# Altium schematic symbol library BARKO_SCHLIB.SchLib: 1064 symbols (part 3 of 11) (continued)
## CON-HEADER-40POS-2.54-R/A
designator CON?, comment PRPC040SGAN-M71RC
CONN HEADER R/A 40POS 2.54MM; Manufacturer: Sullins; Number of Positions: 40; Connector Type: Male Pin; Pitch: 0.1inch; Washability: OK; .Creator: M.OZKAN; .PCBCHK: USED; Supplier 1: Digi-Key; Manufacturer Part Number: PRPC040SGAN-M71RC; Stock 1: 1544; Pricing 1: 1=0,97000, 10=0,86500, 100=0,71250, 500=0,56324, 1000=0,49010 (USD); RoHS: Yes; Mount: Through Hole; Color: Black; Contact Plating: Gold; Package Quantity: 1; Number of Rows: 1; Packaging: Bulk; Termination: Solder; Contact Mating Length: 0.318inch; Lead Free: Lead Free; ComponentLink1URL: https://datasheet.ciiva.com/16477/prpc040sgan-m71rc-16477636.pdf?src-supplier=Future+Electronics; ComponentLink1Description: https://datasheet.ciiva.com/16477/prpc040sgan-m71rc-16477636.pdf?src-supplier=Future+Electronics; ComponentLink2URL: https://datasheet.ciiva.com/741/xrxcxxxsxxn-m71rc-11637-b-741405.pdf?src-supplier=Digi-Key; ComponentLink2Description: https://datasheet.ciiva.com/741/xrxcxxxsxxn-m71rc-11637-b-741405.pdf?src-supplier=Digi-Key; Supplier Part Number 1: S1311EC-40-ND; .SCHCHK: USED
footprint CON-26POS-R/A
pins: 1, 2, 3, 4, 5, 6, 7, 8, 9, 10, 11, 12, 13, 14, 15, 16, 17, 18, 19, 20, 21, 22, 23, 24, 25, 26

## CON-HEADER-40POS-2MM-RA
designator J?, comment 2MM
CONN HEADER R/A 40POS 2MM; Manufacturer: Sullins; Manufacturer Part Number: NRPN401PARN-RC; Connector Type: Male Pin; Number of Positions: 40; Pitch: 0.079inch; Washability: OK; .Creator: M.OZKAN; .PCBCHK: USED; Supplier 1: Digi-Key; Stock 1: 4838; Pricing 1: 1=2,38000, 10=2,13000, 100=1,75390, 500=1,38644, 1000=1,20640 (USD); RoHS: Yes; Mount: Through Hole; Color: Black; Contact Plating: Gold; Package Quantity: 1000; Number of Rows: 1; Packaging: Bulk; Termination: Solder; Contact Mating Length: 0.157inch; ComponentLink1URL: http://www.sullinscorp.com/catalogs/74_PAGE100-101_2mm_MALE_HDR_ST_RA_SMT.pdf?src-supplier=Digi-Key; ComponentLink1Description: http://www.sullinscorp.com/catalogs/74_PAGE100-101_2mm_MALE_HDR_ST_RA_SMT.pdf?src-supplier=Digi-Key; Supplier Part Number 1: S5802-40-ND; .SCHCHK: USED
footprint CON-HEADER-2MM-40POS-RA
pins: 1, 2, 3, 4, 5, 6, 7, 8, 9, 10, 11, 12, 13, 14, 15, 16, 17, 18, 19, 20, 21, 22, 23, 24, 25, 26, 27, 28, 29, 30, 31, 32, 33, 34, 35, 36, 37, 38, 39, 40

## CON-LD09S33E4GX00LF
designator J?  Connector Type: D-Sub  (hidden comment: *)
CONN D-SUB RCPT 9POS R/A SOLDER; Manufacturer: Amphenol FCI; Manufacturer Part Number: LD09S33E4GX00LF; Number of Positions: 9; Voltage Rating: 250V; Current Rating: 5A; .PCBCHK: USED; .Creator: F:TALI; Washability: OK; Supplier 1: Digi-Key; Stock 1: 3385; Pricing 1: 1=0.88, 10=0.775, 25=0.7292, 50=0.6988, 100=0.6684, 300=0.6076, 500=0.54684, 1000=0.48608, 2500=0.44051 (USD); Mount: Through Hole; Number of Pins: 9; Colour: Black; Contact Plating: Gold; Housing Material: Thermoplastic; Min Operating Temperature: -55°C; Max Operating Temperature: 105°C; Packaging: Bulk; Number of Rows: 2; Termination: Solder; Supplier Part Number 1: 609-5193-ND; .SCHCHK: USED
pins: 1 DCD, 2 RXD, 3 TXD, 4 DTR, 5 GND, 6 DSR, 7 RTS, 8 CTS, 9 RI

## CON-M50-4302545
designator J?, comment 1.27 MM
CONN RCPT 50POS 0.05 GOLD SMD; Manufacturer: Harwin; Manufacturer Part Number 1: M50-4302545; Number of Contacts: 50; Connector Type: Receptacle; Max Voltage Rating (AC): 500V; Max Current Rating: 1A; Contact Resistance: 20mR; Pitch: 1.27mm; Row Spacing: 0.05inch; Supplier 1: Digi-Key; Stock 1: 410; Pricing 1: 1=6,02000, 10=5,77300, 100=4,76900, 500=4,01600, 1000=3,51400, 5000=3,26300 (USD); RoHS: Yes; Mount: Surface Mount; Contact Plating: Gold; Housing Material: Nylon; Housing Color: Black; Contact Material: Bronze; Color: Black; Min Operating Temperature: -40°C; Max Operating Temperature: 105°C; Termination: Solder; Number of Rows: 2; Number of Positions: 50; Orientation: Straight; Gender: Receptacle; Packaging: Rail/Tube; Current Rating: 1A; Voltage Rating: 500V; Package Quantity: 17; Contact Gender: Female; Length: 35.5mm; Depth: 4.8mm; Radiation Hardening: No; REACH SVHC: No SVHC; ComponentLink1URL: https://datasheet.ciiva.com/11745/0900766b81034f12-11745785.pdf?src-supplier=RSComponents; ComponentLink1Description: https://datasheet.ciiva.com/11745/0900766b81034f12-11745785.pdf?src-supplier=RSComponents; ComponentLink2URL: https://datasheet.ciiva.com/411/m50-430-411355.pdf?src-supplier=Digi-Key; ComponentLink2Description: https://datasheet.ciiva.com/411/m50-430-411355.pdf?src-supplier=Digi-Key; ComponentLink3URL: https://datasheet.ciiva.com/8047/m50-430-8047100.pdf?src-supplier=Element14; ComponentLink3Description: https://datasheet.ciiva.com/8047/m50-430-8047100.pdf?src-supplier=Element14; ComponentLink4URL: https://datasheet.ciiva.com/9480/m50-430-9480351.pdf?src-supplier=Avnet; ComponentLink4Description: https://datasheet.ciiva.com/9480/m50-430-9480351.pdf?src-supplier=Avnet; Supplier Part Number 1: 952-1406-5-ND
footprint CON-M50-4302545
pins: 1, 2, 3, 4, 5, 6, 7, 8, 9, 10, 11, 12, 13, 14, 15, 16, 17, 18, 19, 20, 21, 22, 23, 24, 25, 26, 27, 28, 29, 30, 31, 32, 33, 34, 35, 36, 37, 38, 39, 40, 41, 42, 43, 44, 45, 46, 47, 48, 49, 50, MP1, MP2

## CON-M80-5000000M1-02-331-00-000
designator J?, comment 4MM  Supplier Part Number 2: 952-4169-ND  Supplier Part Number 3: 952-4170-ND  Supplier Part Number 4: 952-4171-ND  Supplier Part Number 5: 952-3618-ND
CONN HEADER VERT 2POS 4MM; Manufacturer: Harwin; Manufacturer Part Number: M80-5000000M1-02-331-00-000; Number of Contacts: 2; Current Rating: 20A; Voltage Rating: 120V; Gender: Male; Insulation Resistance: 100MR; Connector Type: Power,Male Pin; Contact Resistance: 6mR; Max Voltage Rating (AC): 800V; Washability: OK; .Creator: M.OZKAN; .PCBCHK: USED; Row Spacing: 0.1inch; Supplier 1: Digi-Key; Stock 1: 136; Pricing 1: 1=15.93, 14=14.48, 112=12.30804, 504=10.498, 1008=9.6292 (USD); Mount: Through Hole; Contact Plating: Gold; Color: Black; Contact Material: Brass,Copper Alloy; Housing Material: Polyphenylene; Housing Color: Black; Min Operating Temperature: -55°C; Max Operating Temperature: 125°C; Number of Rows: 1; Termination: Solder; Package Quantity: 1; Packaging: Rail/Tube; Contact Gender: Male; Fastening Type: Threaded; Max Current Rating: 20A; Number of Positions: 2; Orientation: Straight; Length: 18mm; Pitch: 4mm; Depth: 6.05mm; Radiation Hardening: No; REACH SVHC: No SVHC; Flammability Rating: UL94 V-0; ComponentLink1URL: https://cdn.harwin.com/pdfs/Harwin_PC_Datamate.pdf?src-supplier=Digi-Key; ComponentLink1Description: https://cdn.harwin.com/pdfs/Harwin_PC_Datamate.pdf?src-supplier=Digi-Key; ComponentLink2URL: http://www.farnell.com/cad/1499046.pdf?src-supplier=Element14; ComponentLink2Description: http://www.farnell.com/cad/1499046.pdf?src-supplier=Element14; Supplier Part Number 1: 952-1243-ND; Supplier 2: Digi-Key; Stock 2: 321; Pricing 2: 1=1.6, 13=1.45077, 104=1.24317, 507=1.036, 1001=0.888, 5005=0.78736, 10010=0.7696 (USD); Supplier 3: Digi-Key; Stock 3: 226; Pricing 3: 1=2.34, 16=2.11938, 104=1.81654, 504=1.51375, 1000=1.2975, 5000=1.15045 (USD); Supplier 4: Digi-Key; Stock 4: 196; Pricing 4: 1=2.57, 14=2.46714, 105=2.056, 504=1.7476, 1001=1.4906, 5005=1.3364 (USD); Supplier 5: Digi-Key; Manufacturer 5: Harwin; Manufacturer Part Number 5: M50-3930642; Stock 5: 1300; Pricing 5: 1=0,40000, 10=0,37800, 100=0,26460, 500=0,22680, 1000=0,18900, 5000=0,16200, 10000=0,15120 (USD); RoHS: No; .SCHCHK: USED; Supplier 6: Digi-Key; Supplier Part Number 6: 609-5156-1-ND; Stock: 6320; Pricing: 1=1.41, 10=1.243, 100=1.0728 (USD); Lead Free: Lead Free; ComponentLink3URL: https://datasheet.ciiva.com/9473/89898-9473111.pdf?src-supplier=Avnet; ComponentLink3Description: https://datasheet.ciiva.com/9473/89898-9473111.pdf?src-supplier=Avnet; ComponentLink4URL: https://datasheet.ciiva.com/412/89898-412170.pdf?src-supplier=Digi-Key; ComponentLink4Description: https://datasheet.ciiva.com/412/89898-412170.pdf?src-supplier=Digi-Key; ComponentLink5URL: https://datasheet.ciiva.com/16731/89898-16731623.pdf?src-supplier=Avnet+Europe; ComponentLink5Description: https://datasheet.ciiva.com/16731/89898-16731623.pdf?src-supplier=Avnet+Europe; ComponentLink6URL: https://datasheet.ciiva.com/46428/320508-46428539.pdf?src-supplier=Element14; ComponentLink6Description: https://datasheet.ciiva.com/46428/320508-46428539.pdf?src-supplier=Element14
footprint CON-4MM-VERT
pins: 1 GND_IN, 2

## CON-M80-5001242
designator J?, comment 2MM
CONN HEADER VERT 12POS 2MM; Manufacturer: Harwin; Manufacturer Part Number: M80-5001242; Connector Type: Male Pin; Number of Positions: 12; Gender: Male; Insulation Resistance: 100MR; Contact Resistance: 25mR; Current Rating: 3A; Voltage Rating: 120V; Row Spacing: 0.079inch; Washability: OK; .Creator: M.OZKAN; .PCBCHK: USED; Supplier 1: Digi-Key; Stock 1: 7; Pricing 1: 1=9.18000, 12=8.77833, 108=7.38148, 504=6.18450, 1008=5.46630 (USD); RoHS: Yes; Mount: Through Hole; Color: Black; Contact Plating: Gold; Contact Material: Bronze; Housing Color: Black; Housing Material: Polyphenylene; Min Operating Temperature: -55°C; Max Operating Temperature: 125°C; Packaging: Rail/Tube; Package Quantity: 12; Number of Rows: 2; Contact Gender: Male; Termination: Solder; Number of Contacts: 12; Orientation: Straight; Max Current Rating: 3A; Max Voltage Rating (AC): 120V; Fastening Type: Threaded; Length: 22mm; Pitch: 2mm; Depth: 6.05mm; Radiation Hardening: No; REACH SVHC: No SVHC; Flammability Rating: UL94 V-0; ComponentLink1URL: https://datasheet.ciiva.com/5160/m80-500-350314-5160068.pdf?src-supplier=Mouser; ComponentLink1Description: https://datasheet.ciiva.com/5160/m80-500-350314-5160068.pdf?src-supplier=Mouser; ComponentLink2URL: https://datasheet.ciiva.com/11745/0900766b81034f49-11745816.pdf?src-supplier=RSComponents; ComponentLink2Description: https://datasheet.ciiva.com/11745/0900766b81034f49-11745816.pdf?src-supplier=RSComponents; ComponentLink3URL: https://datasheet.ciiva.com/8051/92139-8051717.pdf?src-supplier=Element14; ComponentLink3Description: https://datasheet.ciiva.com/8051/92139-8051717.pdf?src-supplier=Element14; ComponentLink4URL: https://datasheet.ciiva.com/28393/92139-28393164.pdf?src-supplier=Element14; ComponentLink4Description: https://datasheet.ciiva.com/28393/92139-28393164.pdf?src-supplier=Element14; Supplier Part Number 1: 952-1980-ND; .SCHCHK: USED
footprint M80-5001242 (6+6 Pos. Male DIL Vertical Throughboard Conn. Jackscrews)
pins: 1 (in), 2 (in), 3 (in), 4 (in), 5 (in), 6 (in), 7 (in), 8 (in), 9 (in), 10 (in), 11 (in), 12 (in)
text: MATE INFO:M80-4611242

## CON-M83-LMT1M2N36
designator J?, comment 2MM
CONN HEADER VERT 36POS 2MM; Manufacturer 1: Harwin; Manufacturer Part Number 1: M83-LMT1M2N36-0000-000; Voltage Rating: 120V; Number of Positions: 36; Insulation Resistance: 100MR; Gender: Male; Connector Type: Male Pin; Pitch: 0.079inch; Contact Post Length: 3mm; Washability: OK; .Creator: M.OZKAN; .PCBCHK: USED; Supplier 1: Digi-Key; Supplier Part Number 1: 952-3002-ND; Stock 1: 114; Pricing 1: 1=15,29000, 24=13,90000, 48=13,55250, 72=12,51000, 120=11,81500, 264=10,77250, 504=10,07750, 1008=9,24350 (USD); RoHS: Yes; Mount: Through Hole; Contact Plating: Gold; Contact Material: Bronze; Color: Black; Housing Material: Polyphenylene; Min Operating Temperature: -55°C; Max Operating Temperature: 125°C; Contact Gender: Male; Package Quantity: 30; Number of Rows: 3; Termination: Solder; Packaging: Tray; Fastening Type: Threaded; Number of Contacts: 36; Row Spacing: 0.079inch; ComponentLink1URL: http://www.mouser.com/ds/2/181/MIX-TEK2-189389.pdf?src-supplier=Mouser; ComponentLink1Description: http://www.mouser.com/ds/2/181/MIX-TEK2-189389.pdf?src-supplier=Mouser; ComponentLink2URL: https://cdn.harwin.com/pdfs/M83-LMT1M2NXX-0000-000.pdf?src-supplier=Digi-Key; ComponentLink2Description: https://cdn.harwin.com/pdfs/M83-LMT1M2NXX-0000-000.pdf?src-supplier=Digi-Key; ComponentLink3URL: http://cdn.harwin.com/pdfs/60page69.pdf?src-supplier=Digi-Key; ComponentLink3Description: http://cdn.harwin.com/pdfs/60page69.pdf?src-supplier=Digi-Key; .SCHCHK: USED
footprint M83-LMT1M2N36 (Connector Header Through Hole 36 position 0.079" (2.00mm))
pins: 1 (in), 2 (in), 3 (in), 4 (in), 5 (in), 6 (in), 7 (in), 8 (in), 9 (in), 10 (in), 11 (in), 12 (in), 13 (in), 14 (in), 15 (in), 16 (in), 17 (in), 18 (in), 19 (in), 20 (in), 21 (in), 22 (in), 23 (in), 24 (in), 25 (in), 26 (in), 27 (in), 28 (in), 29 (in), 30 (in), 31 (in), 32 (in), 33 (in), 34 (in), 35 (in), 36 (in)
text: MATE INFO:M83-LFC1F2N36

## CON-M225-5201046-10POS
designator J?, comment M225-5201046
CONN HDR 2MM 10POS PCB TIN; Manufacturer: Harwin; Washability: OK; .Creator: M.OZKAN; .PCBCHK: USED; Supplier 1: Digi-Key; Supplier Part Number 1: 952-4169-ND; Manufacturer Part Number: M225-5201046; Stock: 256; Pricing: 1=1.6, 10=1.45, 100=1.2432, 500=1.036, 1000=0.888, 5000=0.7874, 10000=0.7696 (USD); RoHS: No; ComponentLink1URL: http://www.farnell.com/datasheets/2723656.pdf?src-supplier=Farnell; ComponentLink1Description: http://www.farnell.com/datasheets/2723656.pdf?src-supplier=Farnell; .SCHCHK: USED
footprint CON-M225-5201046-10POS
pins: 1 (io), 2 (io), 3 (io), 4 (io), 5 (io), 6 (io), 7 (io), 8 (io), 9 (io), 10 (io)

## CON-M225-5202046-20POS
designator J?, comment M225-5202046
CONN HDR 2MM 20POS PCB TIN; Manufacturer: Harwin; Washability: OK; .Creator: M.OZKAN; .PCBCHK: USED; Supplier 1: Digi-Key; Supplier Part Number 1: 952-4170-ND; Manufacturer Part Number: M225-5202046; Stock: 144; Pricing: 1=2.34, 10=2.119, 100=1.8165, 500=1.5138, 1000=1.2975, 5000=1.1505, 10000=1.1245 (USD); RoHS: No; ComponentLink1URL: http://www.farnell.com/datasheets/2723656.pdf?src-supplier=Farnell; ComponentLink1Description: http://www.farnell.com/datasheets/2723656.pdf?src-supplier=Farnell; .SCHCHK: USED
footprint CON-M225-5202046-20POS
pins: 1 (io), 2 (io), 3 (io), 4 (io), 5 (io), 6 (io), 7 (io), 8 (io), 9 (io), 10 (io), 11 (io), 12 (io), 13 (io), 14 (io), 15 (io), 16 (io), 17 (io), 18 (io), 19 (io), 20 (io)

## CON-M225-5202646-26POS
designator J?, comment M225-5202646
CONN HDR 2MM 26POS PCB TIN; Manufacturer: Harwin; Washability: OK; .Creator: M.OZKAN; .PCBCHK: USED; Supplier 1: Digi-Key; Supplier Part Number 1: 952-4171-ND; Manufacturer Part Number: M225-5202646; Stock: 154; Pricing: 1=2.57, 10=2.467, 100=2.056, 500=1.7476, 1000=1.4906, 5000=1.3364 (USD); RoHS: No; ComponentLink1URL: http://www.farnell.com/datasheets/2723656.pdf?src-supplier=Farnell; ComponentLink1Description: http://www.farnell.com/datasheets/2723656.pdf?src-supplier=Farnell; .SCHCHK: USED
footprint CON-M225-5202646-26POS
pins: 1 (io), 2 (io), 3 (io), 4 (io), 5 (io), 6 (io), 7 (io), 8 (io), 9 (io), 10 (io), 11 (io), 12 (io), 13 (io), 14 (io), 15 (io), 16 (io), 17 (io), 18 (io), 19 (io), 20 (io), 21 (io), 22 (io), 23 (io), 24 (io), 25 (io), 26 (io)

## CON-M225-5203446-34POS
designator J?, comment 2MM
CONN HDR 2MM 34POS PCB TIN; Manufacturer: Harwin; Manufacturer Part Number: M225-5203446; Washability: OK; .Creator: M.OZKAN; .PCBCHK: USED; Supplier 1: Digi-Key; Stock 1: 162; Pricing 1: 1=3.12, 12=2.9925, 102=2.49402, 504=2.1199, 1002=1.80815, 5004=1.6211 (USD); Supplier Part Number 1: 952-4172-ND; .SCHCHK: USED
footprint CON-M225-520344634POS
pins: 1 (io), 2 (io), 3 (io), 4 (io), 5 (io), 6 (io), 7 (io), 8 (io), 9 (io), 10 (io), 11 (io), 12 (io), 13 (io), 14 (io), 15 (io), 16 (io), 17 (io), 18 (io), 19 (io), 20 (io), 21 (io), 22 (io), 23 (io), 24 (io), 25 (io), 26 (io), 27 (io), 28 (io), 29 (io), 30 (io), 31 (io), 32 (io), 33 (io), 34 (io)

## CON-M225-5205046-50POS
designator J?, comment 2MM
CONN HDR 2MM 50POS PCB TIN; Manufacturer: Harwin; Manufacturer Part Number: M225-5205046; Washability: OK; .Creator: M.OZKAN; .PCBCHK: USED; Supplier 1: Digi-Key; Stock 1: 137; Pricing 1: 1=4.21, 12=4.04167, 100=3.368, 500=2.8628, 1000=2.4418 (USD); Supplier Part Number 1: 952-4173-ND; .SCHCHK: USED
footprint CON-M225-5205046-50POS
pins: 1 (io), 2 (io), 3 (io), 4 (io), 5 (io), 6 (io), 7 (io), 8 (io), 9 (io), 10 (io), 11 (io), 12 (io), 13 (io), 14 (io), 15 (io), 16 (io), 17 (io), 18 (io), 19 (io), 20 (io), 21 (io), 22 (io), 23 (io), 24 (io), 25 (io), 26 (io), 27 (io), 28 (io), 29 (io), 30 (io), 31 (io), 32 (io), 33 (io), 34 (io), 35 (io), 36 (io), 37 (io), 38 (io), 39 (io), 40 (io), 41 (io), 42 (io), 43 (io), 44 (io), 45 (io), 46 (io), 47 (io), 48 (io), 49 (io), 50 (io)

## CON-M225-5205046-50POS-V1
designator J?, comment 2MM
CONN HDR 2MM 50POS PCB TIN; Manufacturer: Harwin; Manufacturer Part Number: M225-5205046; Washability: OK; .Creator: M.OZKAN; .PCBCHK: USED; Supplier 1: Digi-Key; Stock 1: 137; Pricing 1: 1=4.21, 12=4.04167, 100=3.368, 500=2.8628, 1000=2.4418 (USD); Supplier Part Number 1: 952-4173-ND; .SCHCHK: USED
footprint CON-M225-5205046-50POS
part A pins: 1 (io), 2 (io), 3 (io), 4 (io), 5 (io), 6 (io), 7 (io), 8 (io), 9 (io), 10 (io), 31 (io), 32 (io), 33 (io), 34 (io), 35 (io), 36 (io), 37 (io), 38 (io), 39 (io), 40 (io), 41 (io), 42 (io), 43 (io), 44 (io), 45 (io), 46 (io)
part B pins: 11 (io), 12 (io), 13 (io), 14 (io), 15 (io), 16 (io), 17 (io), 18 (io), 19 (io), 20 (io), 21 (io), 22 (io), 23 (io), 24 (io), 25 (io), 26 (io), 27 (io), 28 (io), 29 (io), 30 (io), 47 (io), 48 (io), 49 (io), 50 (io)

## CON-M300-MV10345M1
designator J?, comment 3MM
CONN HEADER VERT 3POS 3MM; Manufacturer: Harwin; Manufacturer Part Number: M300-MV10345M1; Number of Positions: 3; Gender: Male; Connector Type: Power,Male Pin; Pitch: 0.118inch; Washability: OK; .Creator: M.OZKAN; .PCBCHK: USED; Supplier 1: Digi-Key; Stock 1: 778; Pricing 1: 1=5, 12=4.795, 108=3.99602, 504=3.39661, 1008=2.8971 (USD); Mount: Through Hole; Number of Pins: 3; Color: Green; Contact Plating: Gold; Contact Material: Brass; Packaging: Rail/Tube; Number of Rows: 1; Termination: Solder; Fastening Type: Threaded; Number of Contacts: 3; REACH SVHC: No SVHC; Supplier Part Number 1: 952-2522-5-ND; .SCHCHK: USED
footprint CON-M300-MV10345M1
pins: 1 GND_IN, 2, 3

## CON-OSTYK51102030
designator J?  Pitch: 9.5mm  Mount: TH  (hidden comment: *)
CONN BARRIER STRIP 2CIRC 0.374"; Manufacturer: On-Shore Technology; Manufacturer Part Number: OSTYK51102030; Voltage Rating: 300V; Number of Circuits: 2; Wire Gauge (Max): 22AWG; Wire Gauge (Min): 10AWG; Current Rating: 30A; .PCBCHK: USED; .Creator: F:TALI; Washability: OK; Supplier 1: Digi-Key; Stock 1: 7444; Pricing 1: 1=1, 10=0.702, 25=0.6548, 50=0.5944, 100=0.5918, 250=0.49972, 500=0.4734, 1000=0.4208, 5000=0.3419 (USD); Colour: Black; Insulation Material: Nylon; Min Operating Temperature: -40°C; Max Operating Temperature: 115°C; Number of Rows: 1; Packaging: Bulk; Number of Wire Entries: 2; Flammability Rating: UL94 V-0; ComponentLink1URL: http://www.on-shore.com/wp-content/uploads/2015/09/ostyk511xx030.pdf; ComponentLink1Description: http://www.on-shore.com/wp-content/uploads/2015/09/ostyk511xx030.pdf; Supplier Part Number 1: ED2953-ND; .SCHCHK: USED
pins: 1 GND_IN, 2

## CON-PCI_EXPRESS_X1-CONSIDE
designator P?, comment PIC_EXPRESS_X1
Washability: OK; .Creator: M.OZKAN; .PCBCHK: USED; .SCHCHK: USED
footprint PCIeX1-GF-2D-1000-1K-O36 (Golden finger, PCIeX1, Dual, Opposite, Pitch 1mm, 36-Position)
pins: A1 (power), A2 (power), A3 (power), A4 (power), A5 (power), A6 (power), A7 (power), A8 (power), A9 (power), A10 (power), A11 (power), A12 (power), A13 (power), A14 (power), A15 (power), A16 (power), A17 (power), A18 (power), B1 (power), B2 (power), B3 (power), B4 (power), B5 (power), B6 (power), B7 (power), B8 (power), B9 (power), B10 (power), B11 (power), B12 (power), B13 (power), B14 (power), B15 (power), B16 (power), B17 (power), B18 (power)
text: PCI EXPRESS X1

## CON-POWER
designator J?, comment POWER
CONN QC TAB 0.187 SOLDER; Manufacturer: Molex; Manufacturer Part Number: 0197084013; Body Plating: Tin; Body Material: Brass; Gender: Male; Insulation: Non-Insulated; Tab Width: 0.187inch; Tab Thickness: 0.032inch; Tab Length: 0.255inch; .Creator: F:TALI; .PCBCHK: USED; Washability: OK; Supplier 1: Digi-Key; Stock 1: 25761; Pricing 1: 1=0.13, 10=0.122, 25=0.0908, 50=0.0778, 100=0.0753, 250=0.06492, 500=0.0623, 1000=0.05452, 2500=0.04932 (USD); Mount: Through Hole; Contact Material: Brass; Contact Plating: Tin; Packaging: Tape and Reel; Package Quantity: 10000; Termination: Standard; Length: 0.51inch; Depth: 6.3mm; ComponentLink1URL: http://www.molex.com/webdocs/datasheets/pdf/en-us/0197084013_QUICK_DISCONNECTS.pdf?src-supplier=Avnet; ComponentLink1Description: http://www.molex.com/webdocs/datasheets/pdf/en-us/0197084013_QUICK_DISCONNECTS.pdf?src-supplier=Avnet; ComponentLink2URL: http://www.molex.com/pdm_docs/sd/197084001_sd.pdf?src-supplier=Digi-Key; ComponentLink2Description: http://www.molex.com/pdm_docs/sd/197084001_sd.pdf?src-supplier=Digi-Key; ComponentLink3URL: http://components.arrow.com/part/dataview/4716213S8383569N3303?src-supplier=Arrow; ComponentLink3Description: http://components.arrow.com/part/dataview/4716213S8383569N3303?src-supplier=Arrow; Supplier Part Number 1: WM14275CT-ND; Supplier 2: Digi-Key; Supplier Part Number 2: 952-3573-ND; .SCHCHK: USED
footprint CON-POWER
pins: 1 GND_IN, 2, 3

## CON-PREC008DAAN-RC
designator J?  Mount: TH  (hidden comment: *)
CONN HEADER .100" DUAL STR 16POS; Manufacturer: Sullins; Manufacturer Part Number: PREC008DAAN-RC; Number of Positions: 16; Connector Type: Male Pin; Pitch: 0.1inch; Mechanical Life: 100000Cycles; Actuator Material: Polyamide; Operating Force: 1.57N; Voltage Rating (DC): 24V; Throw Configuration: SPST; Max Voltage Rating (DC): 12V; Current Rating: 50mA; Illumination Type: Illuminated,Non-Illuminated; Contact Resistance: 100mR; Switch Travel: 0.25mm; Switch Function: Off-Mom; Actuator Type: Standard; Actuator Length: 0.055inch; .PCBCHK: USED; .Creator: F:TALI; Washability: OK; Supplier 1: Digi-Key; Stock 1: 404; Pricing 1: 1=0.35, 10=0.333, 25=0.286, 50=0.243, 100=0.2334, 250=0.2096, 500=0.20008 (USD); Colour: Black; Contact Plating: Tin; Package Quantity: 1; Number of Rows: 2; Packaging: Bulk; Termination: Solder; Row Spacing: 0.1inch; Contact Mating Length: 0.23inch; ComponentLink1URL: https://s3.amazonaws.com/catalogspreads-pdf/PAGE110-111%20.100%20MALE%20HDR%20ST.pdf; ComponentLink1Description: https://s3.amazonaws.com/catalogspreads-pdf/PAGE110-111%20.100%20MALE%20HDR%20ST.pdf; Supplier Part Number 1: S2012EC-08-ND; Case/Package: SMA; Contact Material: Copper Alloy; Min Operating Temperature: -35°C; Max Operating Temperature: 85°C; Orientation: Straight; Contact Current Rating: 50mA; Electrical Life: 100000Cycles; Voltage Rating: 24V; Type: Switch; Length: 6mm; Width: 6mm; REACH SVHC: Unknown; ComponentLink2URL: https://www.alliedelec.com/m/d/12a87fa7d0b178a96761783f66d58fa4.pdf; ComponentLink2Description: https://www.alliedelec.com/m/d/12a87fa7d0b178a96761783f66d58fa4.pdf; ComponentLink3URL: http://www.onlinecomponents.com/productFiles/mf-AO/eng_cat_1308390_0904_e3_e10_.pdf; ComponentLink3Description: http://www.onlinecomponents.com/productFiles/mf-AO/eng_cat_1308390_0904_e3_e10_.pdf; ComponentLink4URL: https://www.te.com/commerce/DocumentDelivery/DDEController?Action=srchrtrv&DocNm=1308111-1_SWITCHES_CORE_PROGRAM_CATALOG&DocType=CS&DocLang=English; ComponentLink4Description: https://www.te.com/commerce/DocumentDelivery/DDEController?Action=srchrtrv&DocNm=1308111-1_SWITCHES_CORE_PROGRAM_CATALOG&DocType=CS&DocLang=English; .SCHCHK: USED
pins: 1, 2, 3, 4, 5, 6, 7, 8, 9, 10, 11, 12, 13, 14, 15, 16

## CON-PT02Y10-6P-SCC-023
designator J?, comment PT02Y10-6P-SCC
PT 6C 6#20 PIN RECP; Manufacturer 1: Amphenol Socapex; Manufacturer Part Number 1: PT02Y10-6P-SCC-023; Body Material: Aluminium; Gender: Receptacle; Number of Contacts: 6; Connector Type: Circular; Washability: OK; .Creator: M.OZKAN; .PCBCHK: USED; Supplier 1: Farnell; Stock 1: 0; Pricing 1: 1=33,95000, 5=30,00000, 10=25,80000, 25=22,24000 (EUR); RoHS: Yes; Contact Material: Copper Alloy; Contact Plating: Gold; Termination: Solder; REACH SVHC: Yes; Supplier Part Number 1: 2270273; .SCHCHK: USED
footprint CON-PT02Y10-6P
pins: A, B, C, D, E, F

## CON-PT02Y12-3P
designator J?, comment PT02Y12-3P
Washability: OK; .Creator: M.OZKAN; .PCBCHK: USED; .SCHCHK: USED
pins: A, B, C

## CON-RJ45
designator J?, comment KLS12-TL091
CONN MAGJACK 1PORT 100 BASE-TX; Manufacturer: Pulse; Manufacturer Part Number: KLS12-TL091-1X1-G/Y-03; Connector Type: RJ45; Number of Ports: 1; Number of Contacts: 8; Gender: Female; Shielding: Shielded; Direction: Down; Number of Cores per Jack: 4; Pitch: 2.54mm; Washability: OK; .Creator: M.OZKAN; .PCBCHK: USED; Supplier 1: Digi-Key; Supplier Part Number 1: 553-1345-ND; Stock 1: 67; Pricing 1: 1=6.260000, 10=6.003000, 25=5.481200, 50=5.220000, 100=4.959000, 250=4.437000, 500=4.176000, 1000=3.654000, 2500=3.471300 (USD); RoHS: Yes; Mount: Through Hole; Color: Green,Yellow; Contact Plating: Gold; Contact Material: Bronze; Housing Material: Thermoplastic; Min Operating Temperature: 0°C; Max Operating Temperature: 70°C; Package Quantity: 25; Orientation: Right Angle; Packaging: Bulk; Termination: Solder; Number of Rows: 1; Number of Positions Loaded: 8; Length: 16.26mm; Depth: 21.59mm; Radiation Hardening: No; Lead Free: Lead Free; ComponentLink1URL: https://datasheet.ciiva.com/3138/+j414-3138717.pdf?src-supplier=Avnet; ComponentLink1Description: https://datasheet.ciiva.com/3138/+j414-3138717.pdf?src-supplier=Avnet; ComponentLink2URL: https://datasheet.ciiva.com/25908/+j414-25908734.pdf?src-supplier=Avnet+Europe; ComponentLink2Description: https://datasheet.ciiva.com/25908/+j414-25908734.pdf?src-supplier=Avnet+Europe; .SCHCHK: USED
footprint CON-RJ45-KLS12-TL091 (MagJack, 14-Leads, Body 21.59x16.13mm)
pins: 1 TD+, 2 TD-, 3 RD+, 4 TCT, 5 RCT, 6 RD-, 7 NC, 8 GND, 9, 10, 11, 12, S1, S2

## CON-RJ45-74980104400
designator T?, comment RJ45
CONN JACK 1PORT 100 BASE-T PCB; Manufacturer: Wurth Electronics; Manufacturer Part Number: 74980104400; ComponentLink1Description: Manufacturer; ComponentLink1URL: http://www.we-online.de; ComponentLink2Description: Datasheet; ComponentLink2URL: https://www.we-online.com/catalog/datasheet/74980104400.pdf; Supplier 1: Digi-Key; Supplier Part Number 1: 732-13939-1-ND; Stock: 86; Pricing: 1=5.82, 5=5.2, 10=4.78, 50=4.26 (USD); RoHS: No
footprint CON-RJ45-74980104400 (10/100Base-T, THT, 1x1, Tab up, w/o shield tabs, LED L-R yellow-green/yellow-green, THR)
pins: 1 TD+, 2 TD-, 3 RD+, 4 CTD, 5 CRD, 6 RD-, 7 NC, 8 GND, 9, 10, 11, 12, S1 Shield, S2 Shield

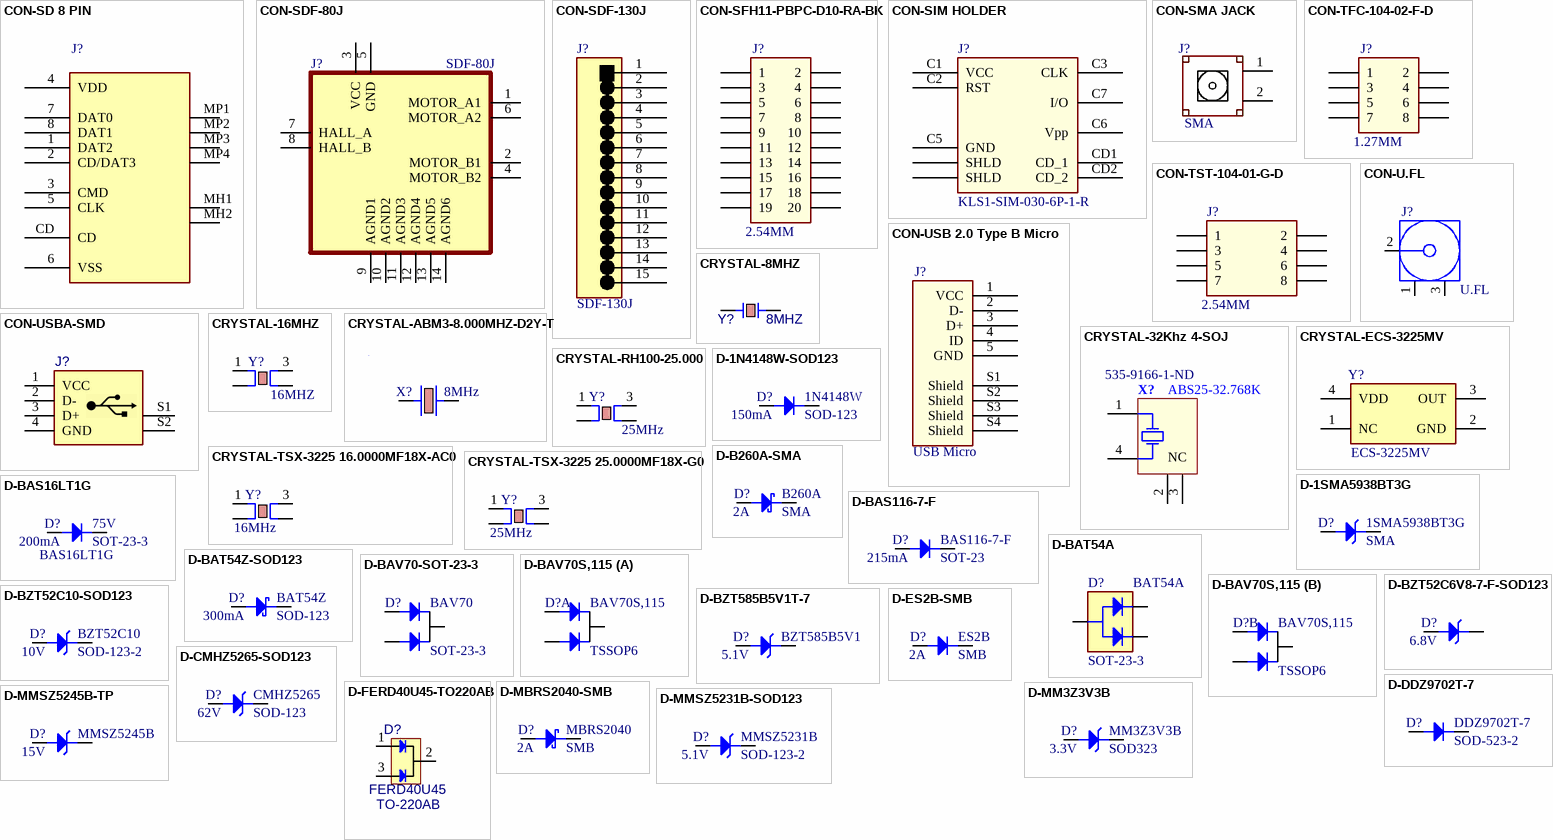
[diagram p9: symbols CON-SD 8 PIN to D-MMSZ5245B-TP]

## CON-SD 8 PIN
designator J?, comment CONNECTOR MICRO SD CARD SMD KLS  (value not drawn)
112J-TDAR-R01-KLS1-TF-003; Manufacturer: Attend; Washability: OK; .Creator: M.OZKAN; .PCBCHK: USED; Supplier 1: TME; Manufacturer Part Number: 112J-TDAR-R01; Stock 1: 5522; Pricing 1: 1=1,23000, 10=1,08000, 50=0,98000, 200=0,88000, 1000=0,74000 (USD); RoHS: No; Supplier Part Number 1: MCC-SDMICRO/3; .SCHCHK: USED
footprint CON-SD CARD 8 PIN
pins: 1 DAT2, 2 CD/DAT3, 3 CMD, 4 VDD, 5 CLK, 6 VSS, 7 DAT0, 8 DAT1, CD, MH1, MH2, MP1, MP2, MP3, MP4

## CON-SDF-80J
designator J?, comment SDF-80J
CONN RCPT FMALE DIN 8POS SOLDER; Manufacturer: CUI; Current Rating: 1A; Connector Type: Jack; Number of Positions: 8; Shielding: Shielded; .Creator: F:TALI; .PCBCHK: USED; Washability: OK; Supplier 1: Mouser; Manufacturer Part Number: SDF-80J; Stock 1: 4717; Pricing 1: 1=2.68, 10=2.57, 50=2.25, 100=2.14, 1000=1.56, 10000=1.56 (USD); Mount: Through Hole; Contact Plating: Tin; Contact Material: Brass; Insulation Material: Plastic; Min Operating Temperature: -40°C; Max Operating Temperature: 85°C; Fastening Type: Pull,Push; Packaging: Bulk; Termination: Solder; Orientation: Horizontal; Number of Contacts: 8; Features: Shielded; Lead Free: Lead Free; Supplier Part Number 1: 490-SDF-80J; .SCHCHK: USED
footprint CON-SDF-80J
pins: 1 MOTOR_A1, 2 MOTOR_B1, 3 VCC (power), 4 MOTOR_B2, 5 GND, 6 MOTOR_A2, 7 HALL_A, 8 HALL_B, 9 AGND1, 10 AGND2, 11 AGND3, 12 AGND4, 13 AGND5, 14 AGND6

## CON-SDF-130J
designator J?, comment SDF-130J
CONN RCPT FMALE DIN 13POS SOLDER; Manufacturer: CUI; Current Rating: 2A; Connector Type: Jack; Number of Positions: 13; Shielding: Shielded; .Creator: F:TALI; .PCBCHK: USED; Washability: OK; Supplier 1: Mouser; Manufacturer Part Number: SDF-130J; Stock 1: 733; Pricing 1: 1=4.5, 10=4.32, 50=3.78, 100=3.6, 1000=2.61, 10000=2.61 (USD); Mount: Through Hole; Contact Plating: Silver; Contact Material: Brass; Insulation Material: Plastic; Min Operating Temperature: -40°C; Max Operating Temperature: 85°C; Fastening Type: Pull,Push; Packaging: Bulk; Termination: Solder; Orientation: Horizontal; Number of Contacts: 13; Features: Shielded; Lead Free: Lead Free; Supplier Part Number 1: 490-SDF-130J; .SCHCHK: USED
footprint CON-SDF130J
pins: 1, 2, 3, 4, 5, 6, 7, 8, 9, 10, 11, 12, 13, 14, 15

## CON-SFH11-PBPC-D10-RA-BK
designator J?, comment 2.54MM
CONN HDR 20POS 0.1 GOLD PCB R/A; Manufacturer 1: Sullins; Manufacturer Part Number: SFH11-PBPC-D10-RA-BK; Number of Positions: 20; Connector Type: Header,Socket; Pitch: 0.1inch; Supplier 1: Digi-Key; Stock 1: 6200; Pricing 1: 1=1,40000, 10=1,26800, 100=1,08680, 500=0,90562, 1000=0,77625, 5000=0,74750 (USD); RoHS: Yes; Mount: Through Hole; Color: Black; Contact Plating: Gold; Package Quantity: 1; Number of Rows: 2; Packaging: Tray; Termination: Solder; Row Spacing: 0.1inch; Lead Free: Lead Free; ComponentLink1URL: https://datasheet.ciiva.com/16226/sfh11-pbpc-d10-ra-bk-16226946.pdf?src-supplier=Future+Electronics; ComponentLink1Description: https://datasheet.ciiva.com/16226/sfh11-pbpc-d10-ra-bk-16226946.pdf?src-supplier=Future+Electronics; ComponentLink2URL: https://datasheet.ciiva.com/754/sfh11-pxxc-dxx-ra-xx11161-c-754566.pdf?src-supplier=Digi-Key; ComponentLink2Description: https://datasheet.ciiva.com/754/sfh11-pxxc-dxx-ra-xx11161-c-754566.pdf?src-supplier=Digi-Key; Supplier Part Number 1: S9205-ND
footprint CON-FP-SFH11-PBPC-D10-RA-BK-MFG
pins: 1, 2, 3, 4, 5, 6, 7, 8, 9, 10, 11, 12, 13, 14, 15, 16, 17, 18, 19, 20

## CON-SIM HOLDER
designator J?, comment KLS1-SIM-030-6P-1-R
CONN SIM CARD PUSH-PUSH R/A SMD; Manufacturer 1: Molex; Manufacturer Part Number 1: 47553-0001; Max Voltage Rating (DC): 50V; Connector Type: Socket; Number of Contacts: 6; Current Rating: 500mA; Gender: Female; Pitch: 1.27mm; Washability: OK; .Creator: M.OZKAN; .PCBCHK: USED; Supplier 1: Digi-Key; Supplier Part Number 1: WM3293CT-ND; RoHS: Yes; Category: Memory Connectors; Stock 1: 1272; Pricing 1: 1=3.54000, 10=3.39600, 25=3.11280, 50=2.97120, 100=2.82960, 250=2.47592 (USD); Mount: Surface Mount; Contact Material: Bronze,Copper Alloy,Copper; Contact Plating: Gold; Housing Material: Nylon; Min Operating Temperature: -20°C; Max Operating Temperature: 85°C; Number of Rows: 2; Orientation: Right Angle; Packaging: Tape and Reel; Package Quantity: 1200; Termination: SMD/SMT; Number of Circuits: 6; Voltage Rating (DC): 50V; Length: 20.95mm; Depth: 26.5mm; Width: 19.35mm; Radiation Hardening: No; Lead Free: Lead Free; REACH SVHC: Unknown; ComponentLink1URL: https://datasheet.ciiva.com/1104/ps-47553-201-1104611.pdf?src-supplier=Element14; ComponentLink1Description: https://datasheet.ciiva.com/1104/ps-47553-201-1104611.pdf?src-supplier=Element14; ComponentLink2URL: https://datasheet.ciiva.com/30230/0475530001-memory-card-socket-30230845.pdf?src-supplier=Onlinecomponents.com; ComponentLink2Description: https://datasheet.ciiva.com/30230/0475530001-memory-card-socket-30230845.pdf?src-supplier=Onlinecomponents.com; ComponentLink3URL: https://datasheet.ciiva.com/46391/1912411-46391052.pdf?src-supplier=Element14; ComponentLink3Description: https://datasheet.ciiva.com/46391/1912411-46391052.pdf?src-supplier=Element14; ComponentLink4URL: https://datasheet.ciiva.com/9464/0475530001-memory-card-socket-9464895.pdf?src-supplier=Avnet; ComponentLink4Description: https://datasheet.ciiva.com/9464/0475530001-memory-card-socket-9464895.pdf?src-supplier=Avnet; .SCHCHK: USED
footprint CON-SIM (MOLEX:0475530001,KLS:693013050811)
pins: C1 VCC, C2 RST, C3 CLK, C5 GND, C6 Vpp, C7 I/O, CD1 CD_1, CD2 CD_2, MP1 SHLD, MP2 SHLD

## CON-SMA JACK
designator J?, comment SMA
CONN SMA JACK STR 50 OHM PCB; Manufacturer: TE Connectivity; Manufacturer Part Number: 5-1814832-1; Body Material: Zinc; Plating: Nickel; Body Plating: Gold; Dielectric Material: PTFE; Impedance: 50R; Frequency: 3GHz; Gender: Female; Connector Type: Jack,SMA; Polarity: Normal; Wire/Cable Type: Coaxial; Insulation Resistance: 5GR; Connector System: Cable-to-Board; Number of Positions: 1; Sealable: No (Without); Tail Length: 4mm; .Creator: F:TALI; .PCBCHK: USED; Washability: OK; Supplier 1: Digi-Key; Stock 1: 45089; Pricing 1: 1=1.99, 10=1.804, 25=1.6936, 50=1.62, 100=1.5464, 250=1.39908, 500=1.28864, 1000=1.10454 (USD); Mount: PCB,Through Hole; Case/Package: SMA; Contact Material: Bronze; Contact Plating: Gold; Insulation Material: Polytetrafluoroethylene; Min Operating Temperature: -67°C; Max Operating Temperature: 185°C; Termination: Through Hole; Orientation: Straight; Package Quantity: 1; Fastening Type: Threaded; Packaging: Box; Max Frequency: 3GHz; Length: 0.532inch; Depth: 6.4mm; Radiation Hardening: No; REACH SVHC: No SVHC; Lead Free: Lead Free; ELV: Compliant; ComponentLink1URL: https://www.te.com/commerce/DocumentDelivery/DDEController?Action=srchrtrv&DocNm=1814832&DocType=Customer+Drawing&DocLang=English&src-supplier=Digi-Key; ComponentLink1Description: https://www.te.com/commerce/DocumentDelivery/DDEController?Action=srchrtrv&DocNm=1814832&DocType=Customer+Drawing&DocLang=English&src-supplier=Digi-Key; ComponentLink2URL: http://www.te.com/commerce/DocumentDelivery/DDEController?Action=showdoc&DocId=Customer+Drawing%7F1814832%7FA%7Fpdf%7FEnglish%7FENG_CD_1814832_A.pdf&src-supplier=Avnet; ComponentLink2Description: http://www.te.com/commerce/DocumentDelivery/DDEController?Action=showdoc&DocId=Customer+Drawing%7F1814832%7FA%7Fpdf%7FEnglish%7FENG_CD_1814832_A.pdf&src-supplier=Avnet; ComponentLink3URL: https://www.verical.com/server-webapp/html/getDatasheet?partID=396696&src-supplier=Verical; ComponentLink3Description: https://www.verical.com/server-webapp/html/getDatasheet?partID=396696&src-supplier=Verical; ComponentLink4URL: http://www.onlinecomponents.com/productFiles/mf-AMP/eng_cd_1814832_a.pdf?src-supplier=Onlinecomponents.com; ComponentLink4Description: http://www.onlinecomponents.com/productFiles/mf-AMP/eng_cd_1814832_a.pdf?src-supplier=Onlinecomponents.com; ComponentLink5URL: http://www.te.com/commerce/DocumentDelivery/DDEController?Action=showdoc&DocId=Customer+Drawing%7F1814832%7FA%7Fpdf%7FEnglish%7FENG_CD_1814832_A.pdf&src-supplier=Avnet+Europe; ComponentLink5Description: http://www.te.com/commerce/DocumentDelivery/DDEController?Action=showdoc&DocId=Customer+Drawing%7F1814832%7FA%7Fpdf%7FEnglish%7FENG_CD_1814832_A.pdf&src-supplier=Avnet+Europe; ComponentLink6URL: http://www.te.com/commerce/DocumentDelivery/DDEController?Action=showdoc&DocId=Customer+Drawing%7F1814832%7FA%7Fpdf%7FEnglish%7FENG_CD_1814832_A.pdf&src-supplier=Avnet+Asia; ComponentLink6Description: http://www.te.com/commerce/DocumentDelivery/DDEController?Action=showdoc&DocId=Customer+Drawing%7F1814832%7FA%7Fpdf%7FEnglish%7FENG_CD_1814832_A.pdf&src-supplier=Avnet+Asia; ComponentLink7URL: http://www.farnell.com/datasheets/1803168.pdf?src-supplier=Newark; ComponentLink7Description: http://www.farnell.com/datasheets/1803168.pdf?src-supplier=Newark; ComponentLink8URL: http://www1.futureelectronics.com/doc/TE%20CONNECTIVITY/5-1814832-1.pdf?src-supplier=Future+Electronics; ComponentLink8Description: http://www1.futureelectronics.com/doc/TE%20CONNECTIVITY/5-1814832-1.pdf?src-supplier=Future+Electronics; Supplier Part Number 1: A97594-ND; .SCHCHK: USED
footprint CON-SMA
pins: 1, 2

## CON-TFC-104-02-F-D
designator J?, comment 1.27MM
.050 X .050 TERMINAL STRIP; Manufacturer: Samtec; MP: TFC-104-02-F-D; MF: Samtec Inc.; Package: None; Availability: Unavailable; Price: None; Manufacturer Part Number: TFC-104-02-F-D; RoHS: No; Category: Connectors; Supplier 1: Mouser; Supplier Part Number 1: 200-TFC10402FD; Stock: 158; Pricing: 1=1.42, 10=1.24, 25=1.16, 100=1.13, 250=1.04, 500=0.879 (USD)
footprint CON-TFC-104-02-F-D
pins: 1, 2, 3, 4, 5, 6, 7, 8

## CON-TST-104-01-G-D
designator J?, comment 2.54MM
Connector Header Through Hole 8 position 0.100 (2.54mm); MP: TST-104-01-G-D; MF: Samtec; Number of Contacts: 8; Gender: Male; Availability: Bad; Price: None; Package: None; SnapEDA_Link: https://www.snapeda.com/parts/TST-104-01-G-D/Samtec/view-part/3256031/?ref=snap; Value: *; BuyPart: https://www.snapeda.com/parts/TST-104-01-G-D/Samtec/view-part/3256031/?ref=eda; Supplier 1: Mouser; Manufacturer 1: Samtec; Manufacturer Part Number: TST-104-01-G-D; Stock 1: 382; Pricing 1: 1=2,02000, 10=1,76000, 25=1,64000, 100=1,62000, 250=1,49000, 500=1,25000, 1000=1,13000, 1=2,38000, 10=2,08000, 25=1,94000, 100=1,91000, 250=1,76000, 500=1,48000 (EUR); RoHS: Yes; Mount: Through Hole; Contact Plating: Gold; Termination: Solder; Number of Rows: 2; Packaging: Bulk; Pitch: 2.54mm; Radiation Hardening: No; ComponentLink1URL: https://datasheet.ciiva.com/10161/htst-10161119.pdf?src-supplier=Avnet; ComponentLink1Description: https://datasheet.ciiva.com/10161/htst-10161119.pdf?src-supplier=Avnet; Supplier Part Number 1: 200-TST10401GD
footprint CON-TST-104-01-G-D
pins: 1, 2, 3, 4, 5, 6, 7, 8

## CON-U.FL
designator J?, comment U.FL